# Altium footprint library 集大电协1.5.PcbLib: 283 footprints (part 9 of 18)
Each footprint in its own frame and in the unit in brackets; x right, y up, seen from the top. Pads: shape width x height; smd on the part's side, far side on the other; paste and mask are expansions set on the pad; w line width, h text height; cw(c..) or ccw(c..) is an arc to the next point about the centre after c.
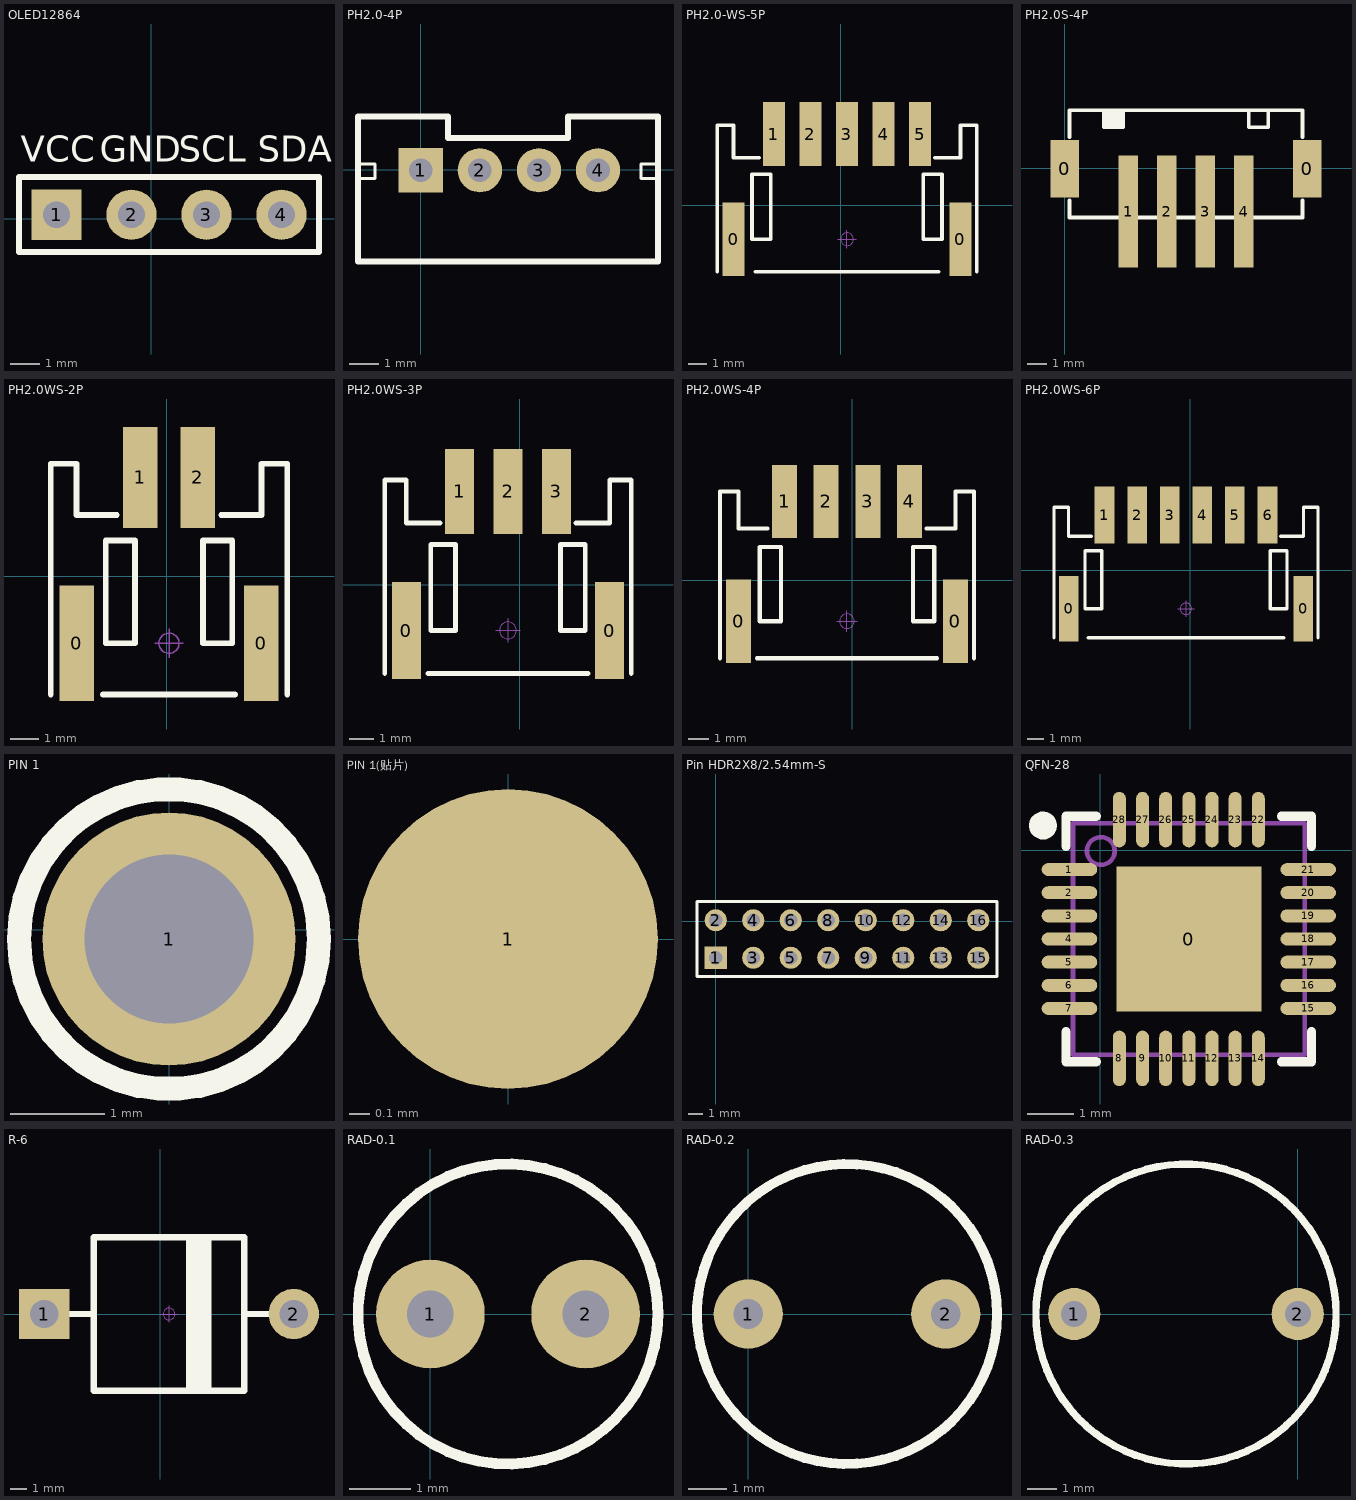
[diagram p8: the footprints below, top view; thin cyan lines are the x and y axes]

## OLED12864 [mm]
pads (4):
  rect 1.7x1.7 hole 0.9: 1(-3.215,0.14)
  round 1.7 hole 0.9: 2(-0.675,0.14) 3(1.865,0.14) 4(4.405,0.14)
Top Overlay:
  lines w0.2: -4.485,-1.13 -4.485,1.41 5.675,1.41 5.675,-1.13 -4.485,-1.13
  text "VCC" at -4.425,1.65 h1.5
  text "GND" at -1.75,1.65 h1.5
  text "SCL" at 0.925,1.65 h1.5
  text "SDA" at 3.6,1.65 h1.5
3D body "User Library-128x64I2COLEDDisplayAdafruit.step": height 13.47, standoff 2.63, extent -12.8,-25.455 13.9,2.405
3D body "HDR2.54-1P_M.STEP": height 8.5, standoff -3, extent -1.945,-1.13 0.595,1.41
3D body "HDR2.54-1P_M.STEP": height 8.5, standoff -3, extent -4.485,-1.13 -1.945,1.41
3D body "HDR2.54-1P_M.STEP": height 8.5, standoff -3, extent 3.135,-1.13 5.675,1.41
3D body "HDR2.54-1P_M.STEP": height 8.5, standoff -3, extent 0.595,-1.13 3.135,1.41

## PH2.0-4P [mm]
pads (4):
  rect 1.5x1.5 hole 0.8: 1(-0.004,-0.011)
  round 1.5 hole 0.8: 2(1.996,-0.011) 3(3.996,-0.011) 4(5.996,-0.011)
Top Overlay:
  lines w0.1: -2.132,-0.295 -1.552,-0.295 -1.552,0.205 -2.132,0.205 ; 8.028,-0.295 7.448,-0.295 7.448,0.205 8.028,0.205
  lines w0.2: -2.132,1.805 -2.132,-3.095 8.028,-3.095 8.028,1.805 ; 0.916,1.805 0.916,1.089 4.98,1.089 4.98,1.805
  lines w0.203: -2.132,1.805 0.916,1.805 ; 4.98,1.805 8.028,1.805
3D body "PH2.0-LI-4P.STEP": height 6.01, standoff -2.99, extent -1.932,-3.021 7.968,1.679

## PH2.0-WS-5P [mm]
pads (7):
  rect 1.2x4 smd: 0(-5.863,-1.864) 0(6.537,-1.864)
  rect 1.2x3.5 smd: 1(-3.663,3.886) 2(-1.663,3.886) 3(0.337,3.886) 4(2.337,3.886) 5(4.337,3.886)
Top Overlay:
  lines w0.2: -6.759,-3.636 -6.759,4.365 -5.87,4.365 -5.87,2.587 -4.473,2.587 ; -4.663,-3.636 5.337,-3.636 ; 5.147,2.587 6.544,2.587 6.544,4.365 7.433,4.365 7.433,-3.636 ; -4.854,-1.858 -4.854,1.698 -3.838,1.698 -3.838,-1.858 -4.854,-1.858 ; 4.512,-1.858 4.512,1.698 5.528,1.698 5.528,-1.858 4.512,-1.858
Mechanical 15:
  circle w0.05: c0.337,-1.858 r0.35
  lines w0.05: -0.163,-1.858 0.837,-1.858 ; 0.337,-2.358 0.337,-1.358
3D body "PH2.0 SMD-W-5P.STEP": height 5.55, standoff 0.05, extent -6.663,-3.508 7.337,5.092

## PH2.0S-4P [mil]
pads (6):
  rect 59.06x118.11 smd: 0(-0.16,-1.22) 0(497.32,-1.22)
  rect 40x230 smd: 1(130.47,-89.33) 2(209.21,-89.33) 3(287.95,-89.33) 4(366.69,-89.33)
Top Overlay:
  rectangle: 79.84,83.78 119.84,118.78
  lines w7.87: 9.84,-66.22 9.84,-101.22 487.32,-101.22 487.32,-66.22 ; 9.84,63.78 9.84,118.78 487.32,118.78 487.32,63.78 ; 79.84,118.78 79.84,83.78 119.84,83.78 119.84,118.78 ; 377.32,118.78 377.32,83.78 417.32,83.78 417.32,118.78
3D body "PH2.0-LS-4P.STEP": height 242.13, standoff 0, extent 12.36,-190.31 484.8,116.78

## PH2.0WS-2P [mm]
pads (4):
  rect 1.2x4 smd: 0(-3.114,-2.321) 0(3.286,-2.321)
  rect 1.2x3.5 smd: 1(-0.914,3.429) 2(1.086,3.429)
Top Overlay:
  lines w0.2: -4.01,-4.093 -4.01,3.908 -3.121,3.908 -3.121,2.13 -1.724,2.13 ; -2.2,-4.093 2.372,-4.093 ; 1.896,2.13 3.293,2.13 3.293,3.908 4.182,3.908 4.182,-4.093 ; -2.105,-2.315 -1.089,-2.315 -1.089,1.241 -2.105,1.241 -2.105,-2.315 ; 1.261,-2.315 2.277,-2.315 2.277,1.241 1.261,1.241 1.261,-2.315
Mechanical 15:
  circle w0.05: c0.086,-2.315 r0.35
  lines w0.05: -0.414,-2.315 0.586,-2.315 ; 0.086,-2.815 0.086,-1.815
3D body "PH2.0 SMD-W-2P.STEP": height 5.55, standoff 0.05, extent -3.914,-3.965 4.086,4.635

## PH2.0WS-3P [mm]
pads (5):
  rect 1.2x4 smd: 0(-4.685,-1.889) 0(3.715,-1.889)
  rect 1.2x3.5 smd: 1(-2.485,3.861) 2(-0.485,3.861) 3(1.515,3.861)
Top Overlay:
  lines w0.2: -5.581,-3.661 -5.581,4.34 -4.692,4.34 -4.692,2.562 -3.295,2.562 ; -3.787,-3.661 2.817,-3.661 ; 2.325,2.562 3.722,2.562 3.722,4.34 4.611,4.34 4.611,-3.661 ; -3.676,-1.883 -3.676,1.673 -2.66,1.673 -2.66,-1.883 -3.676,-1.883 ; 1.69,-1.883 1.69,1.673 2.706,1.673 2.706,-1.883 1.69,-1.883
Mechanical 15:
  circle w0.05: c-0.485,-1.883 r0.35
  lines w0.05: -0.985,-1.883 0.015,-1.883 ; -0.485,-2.383 -0.485,-1.383
3D body "PH2.0 SMD-W-3P.STEP": height 5.55, standoff 0.05, extent -5.485,-3.533 4.515,5.067

## PH2.0WS-4P [mm]
pads (6):
  rect 1.2x4 smd: 0(-5.445,-1.962) 0(4.955,-1.962)
  rect 1.2x3.5 smd: 1(-3.245,3.788) 2(-1.245,3.788) 3(0.755,3.788) 4(2.755,3.788)
Top Overlay:
  lines w0.2: -6.341,-3.735 -6.341,4.266 -5.452,4.266 -5.452,2.488 -4.055,2.488 ; -4.563,-3.735 4.073,-3.735 ; 3.565,2.488 4.962,2.488 4.962,4.266 5.851,4.266 5.851,-3.735 ; -4.436,-1.957 -3.42,-1.957 -3.42,1.599 -4.436,1.599 -4.436,-1.957 ; 2.93,-1.957 3.946,-1.957 3.946,1.599 2.93,1.599 2.93,-1.957
Mechanical 15:
  circle w0.05: c-0.245,-1.957 r0.35
  lines w0.05: -0.745,-1.957 0.255,-1.957 ; -0.245,-2.457 -0.245,-1.457
3D body "PH2.0 SMD-W-4P.STEP": height 5.55, standoff 0.05, extent -6.245,-3.607 5.755,4.993

## PH2.0WS-6P [mm]
pads (8):
  rect 1.2x4 smd: 0(-7.453,-2.365) 0(6.947,-2.365)
  rect 1.2x3.5 smd: 1(-5.253,3.385) 2(-3.253,3.385) 3(-1.253,3.385) 4(0.747,3.385) 5(2.747,3.385) 6(4.747,3.385)
Top Overlay:
  lines w0.2: -8.349,-4.137 -8.349,3.864 -7.46,3.864 -7.46,2.086 -6.063,2.086 ; -6.253,-4.137 5.747,-4.137 ; 5.557,2.086 6.954,2.086 6.954,3.864 7.843,3.864 7.843,-4.137 ; -6.444,-2.359 -5.428,-2.359 -5.428,1.197 -6.444,1.197 -6.444,-2.359 ; 4.922,-2.359 5.938,-2.359 5.938,1.197 4.922,1.197 4.922,-2.359
Mechanical 15:
  circle w0.05: c-0.253,-2.359 r0.35
  lines w0.05: -0.753,-2.359 0.247,-2.359 ; -0.253,-2.859 -0.253,-1.859
3D body "PH2.0 SMD-W-6P.STEP": height 5.55, standoff 0.05, extent -8.253,-4.009 7.747,4.591

## PIN 1 [mm]
pads (1):
  round 2.7 hole 1.8: 1(0,-0.1)
Top Overlay:
  circle w0.254: c0,-0.1 r1.6

## PIN 1(贴片) [mm]
pads (1):
  round 1.5 smd: 1(0,0)

## Pin HDR2X8/2.54mm-S [mm]
pads (16):
  rect 1.5x1.5 hole 0.9: 1(0.001,-2.463)
  round 1.5 hole 0.9: 2(0.001,0.077) 3(2.541,-2.463) 4(2.541,0.077) 5(5.081,-2.463) 6(5.081,0.077) 7(7.621,-2.463) 8(7.621,0.077) 9(10.161,-2.463) 10(10.161,0.077) 11(12.701,-2.463) 12(12.701,0.077) 13(15.241,-2.463) 14(15.241,0.077) 15(17.781,-2.463) 16(17.781,0.077)
Top Overlay:
  lines w0.2: -1.269,-3.733 19.051,-3.733 19.051,1.347 -1.269,1.347 -1.269,-3.733
3D body "HEADER.STEP": height 7.58, standoff -2.94, extent 16.511,-1.193 19.051,1.347
3D body "HEADER.STEP": height 7.58, standoff -2.94, extent 16.511,-3.733 19.051,-1.193
3D body "HEADER.STEP": height 7.58, standoff -2.94, extent 13.971,-1.193 16.511,1.347
3D body "HEADER.STEP": height 7.58, standoff -2.94, extent 13.971,-3.733 16.511,-1.193
3D body "HEADER.STEP": height 7.58, standoff -2.94, extent 11.431,-1.193 13.971,1.347
3D body "HEADER.STEP": height 7.58, standoff -2.94, extent 11.431,-3.733 13.971,-1.193
3D body "HEADER.STEP": height 7.58, standoff -2.94, extent 8.891,-1.193 11.431,1.347
3D body "HEADER.STEP": height 7.58, standoff -2.94, extent 8.891,-3.733 11.431,-1.193
3D body "HEADER.STEP": height 7.58, standoff -2.94, extent 6.351,-1.193 8.891,1.347
3D body "HEADER.STEP": height 7.58, standoff -2.94, extent 6.351,-3.733 8.891,-1.193
3D body "HEADER.STEP": height 7.58, standoff -2.94, extent 3.811,-1.193 6.351,1.347
3D body "HEADER.STEP": height 7.58, standoff -2.94, extent 3.811,-3.733 6.351,-1.193
3D body "HEADER.STEP": height 7.58, standoff -2.94, extent 1.271,-1.193 3.811,1.347
3D body "HEADER.STEP": height 7.58, standoff -2.94, extent 1.271,-3.733 3.811,-1.193
3D body "HEADER.STEP": height 7.58, standoff -2.94, extent -1.269,-1.193 1.271,1.347
3D body "HEADER.STEP": height 7.58, standoff -2.94, extent -1.269,-3.733 1.271,-1.193

## QFN-28 [mm] "CP2102  USB转串口芯片"
pads (29):
  rect 3.13x3.13 smd mask+0.051: 0(1.909,-1.918)
  oval 1.2x0.28 smd mask+0.051: 1(-0.668,-0.418) 2(-0.668,-0.918) 3(-0.668,-1.418) 4(-0.668,-1.918) 5(-0.668,-2.418) 6(-0.668,-2.918) 7(-0.668,-3.418) 15(4.486,-3.418) 16(4.486,-2.918) 17(4.486,-2.418) 18(4.486,-1.918) 19(4.486,-1.418) 20(4.486,-0.918) 21(4.486,-0.418)
  oval 0.28x1.2 smd mask+0.051: 8(0.409,-4.495) 9(0.909,-4.495) 10(1.409,-4.495) 11(1.909,-4.495) 12(2.409,-4.495) 13(2.909,-4.495) 14(3.409,-4.495) 22(3.409,0.66) 23(2.909,0.66) 24(2.409,0.66) 25(1.909,0.66) 26(1.409,0.66) 27(0.909,0.66) 28(0.409,0.66)
Top Overlay:
  circle w0.3: c-1.241,0.532 r0.15
  lines w0.2: -0.741,-3.918 -0.741,-4.568 -0.091,-4.568 ; -0.741,0.082 -0.741,0.732 -0.091,0.732 ; 3.909,-4.568 4.559,-4.568 4.559,-3.918 ; 3.909,0.732 4.559,0.732 4.559,0.082
Mechanical 13:
  circle w0.1: c0.009,-0.018 r0.3
  lines w0.1: -0.591,-4.418 -0.591,0.582 4.409,0.582 4.409,-4.418 -0.591,-4.418
3D body "User Library-QFN28-0_5.STEP": height 1, standoff 0, extent -0.578,-4.416 4.422,0.584

## R-6 [mm] "二极管"
pads (2):
  rect 3x3 hole 1.7: 1(-6.917,0.025)
  round 3 hole 1.7: 2(7.983,0.025)
Top Overlay:
  rectangle: 1.549,-4.547 3.073,4.597
  lines w0.381: -5.523,0.025 -3.967,0.025 ; 5.033,0.025 6.557,0.025 ; -3.967,-4.547 -3.967,4.597 5.033,4.597 5.033,-4.547 -3.967,-4.547
Mechanical 15:
  circle w0.05: c0.533,0.025 r0.35
  lines w0.05: 0.033,0.025 1.033,0.025 ; 0.533,-0.475 0.533,0.525
3D body "R-6.STEP": height 8.85, standoff -3.45, extent -7.567,-4.376 8.633,4.426

## RAD-0.1 [mil]
pads (2):
  round 70 hole 30: 1(0,0) 2(100,0)
Top Overlay:
  circle w7: c50,0 r96.65

## RAD-0.2 [mil]
pads (2):
  round 70 hole 30: 1(0,0) 2(200,0)
Top Overlay:
  circle w10: c100,0 r151.92
3D body: height 472.44, standoff -98.43, extent -96.56,-197.84 296.57,195.86

## RAD-0.3 [mil]
pads (2):
  round 70 hole 35: 1(-300,0) 2(0,0)
Top Overlay:
  circle w10: c-150,0 r201.21
3D body: height 1000, standoff -1131.89, extent -417,-243.84 102.01,275.84